# Altium footprint library MainFPs.PcbLib: 215 footprints (part 1 of 14)
Each footprint in its own frame and in the unit in brackets; x right, y up, seen from the top. Pads: shape width x height; smd on the part's side, far side on the other; paste and mask are expansions set on the pad; w line width, h text height; cw(c..) or ccw(c..) is an arc to the next point about the centre after c.
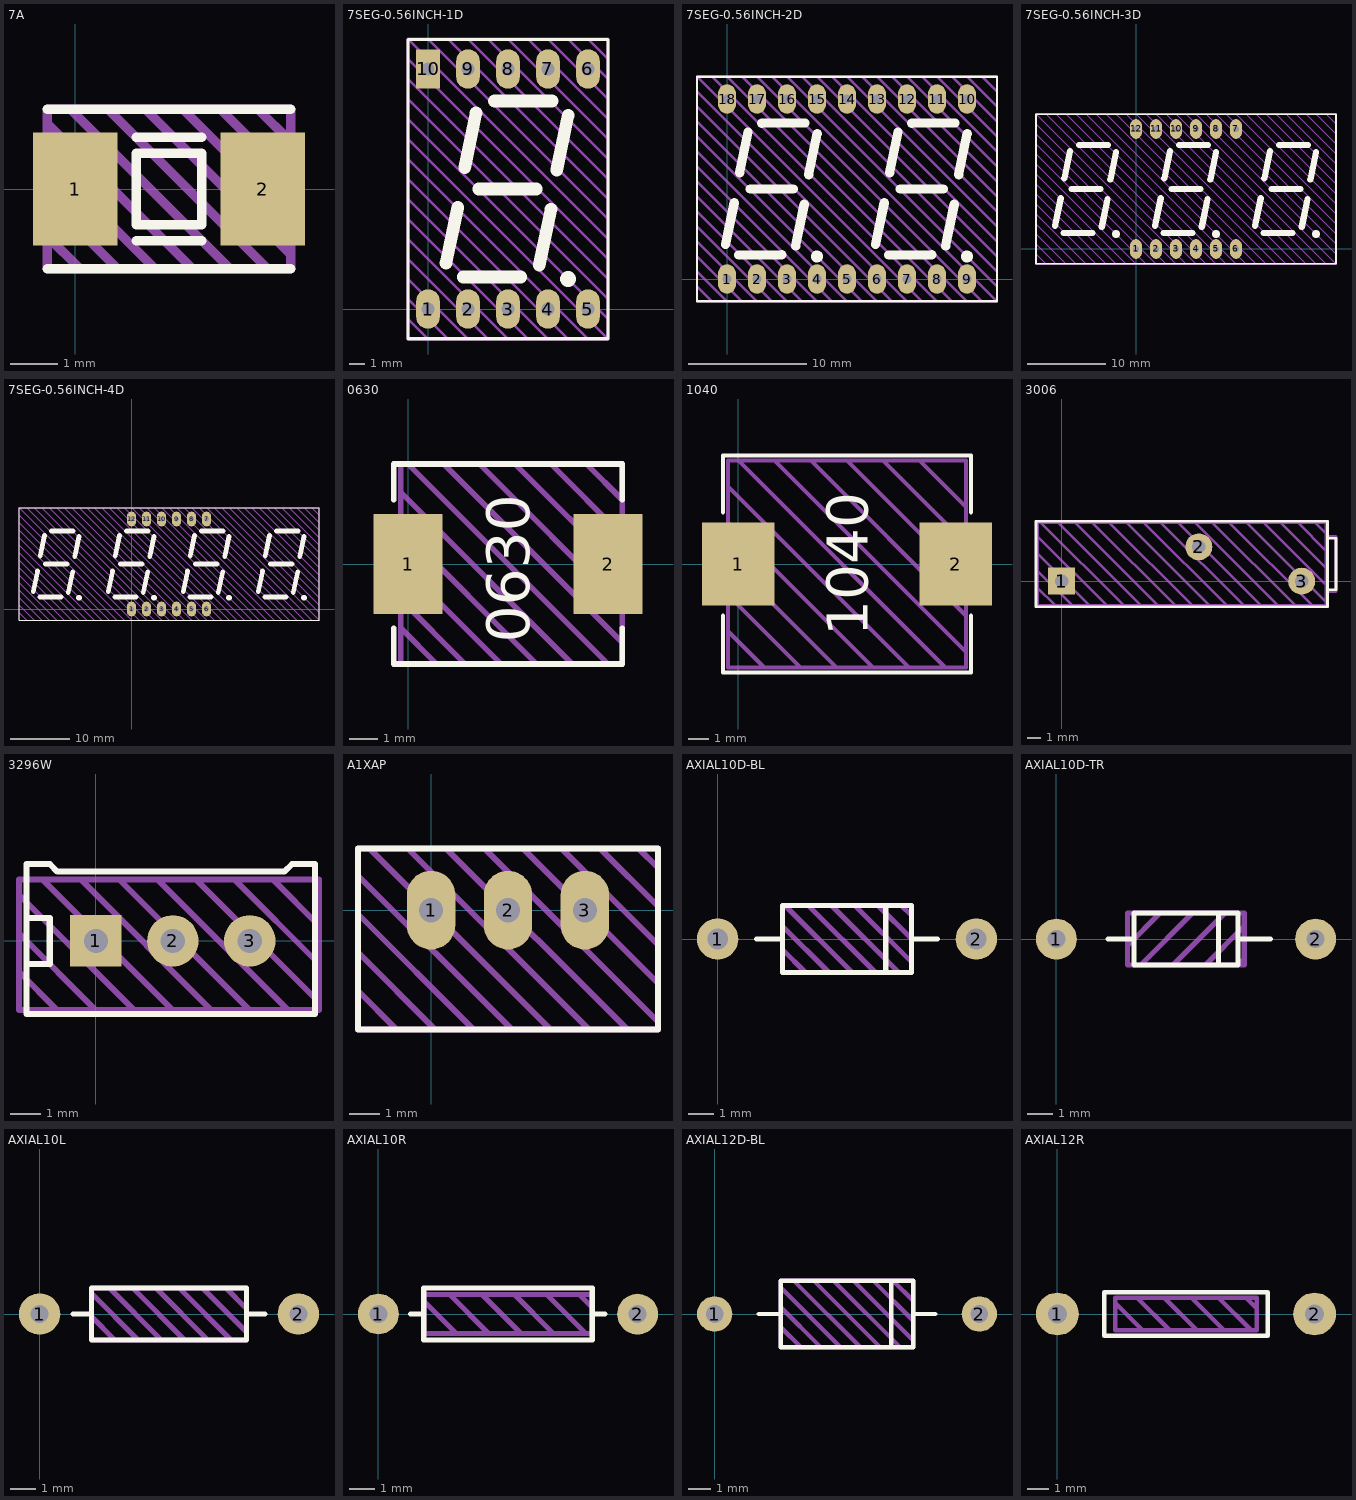
[diagram p0: the footprints below, top view; thin cyan lines are the x and y axes]

## 7A [mm] "SMD Glass Sealing Crystals"
pads (2):
  rect 1.8x2.4 smd: 1(0,0) 2(4,0)
Top Overlay:
  lines w0.2: -0.6,-1.7 4.6,-1.7 ; -0.6,1.7 4.6,1.7 ; 1.3,-1.1 2.7,-1.1 ; 1.3,1.1 2.7,1.1 ; 1.3,-0.762 2.7,-0.762 2.7,0.762 1.3,0.762 1.3,-0.762
Top Draw:
  lines w0.2: -0.6,-1 0.1,-1.7 ; -0.6,-0.2 0.9,-1.7 ; -0.6,0.6 1.7,-1.7 ; -0.6,1.4 2.5,-1.7 ; -0.1,1.7 3.3,-1.7 ; 0.7,1.7 4.1,-1.7 ; 1.5,1.7 4.6,-1.4 ; 2.3,1.7 4.6,-0.6 ; 3.1,1.7 4.6,0.2 ; 3.9,1.7 4.6,1 ; -0.6,-1.7 4.6,-1.7 4.6,1.7 -0.6,1.7 -0.6,-1.7
Top Info:
  text "'.Comment'" at -1.186,-2.837 h0.75
3D body: height 0.6, standoff 0, extent -0.6,-1.7 4.6,1.7
3D body: height 0.8, standoff 0.6, extent -0.4,-1.5 4.4,1.5

## 7SEG-0.56INCH-1D [mm]
pads (10):
  oval 1.5x2.5 hole 0.8: 1(0,0) 2(2.54,0) 3(5.08,0) 4(7.62,0) 5(10.16,0) 6(10.16,15.24) 7(7.62,15.24) 8(5.08,15.24) 9(2.54,15.24)
  rect 1.5x2.5 hole 0.8: 10(0,15.24)
Top Overlay:
  circle w0.8: c8.89,1.905 r0.1
  lines w0.2: -1.27,-1.887 10.584,-1.887 11.43,-1.887 11.43,17.113 -1.27,17.113 -1.27,-1.887
  lines w0.8: 1.143,2.921 1.88,6.45 ; 2.248,2.032 5.898,2.035 ; 2.331,8.988 3.048,12.446 ; 3.23,7.62 6.879,7.62 ; 4.224,13.205 7.874,13.208 ; 7.074,2.794 7.811,6.323 ; 8.177,8.829 8.894,12.287
Top Draw:
  lines w0.2: -1.27,-0.635 0,-1.905 ; -1.27,0.635 1.27,-1.905 ; -1.27,1.905 2.54,-1.905 ; -1.27,3.175 3.81,-1.905 ; -1.27,4.445 5.08,-1.905 ; -1.27,5.715 6.35,-1.905 ; -1.27,6.985 7.62,-1.905 ; -1.27,8.255 8.89,-1.905 ; -1.27,9.525 10.16,-1.905 ; -1.27,10.795 11.43,-1.905 ; -1.27,12.065 11.43,-0.635 ; -1.27,13.335 11.43,0.635 ; -1.27,14.605 11.43,1.905 ; -1.27,15.875 11.43,3.175 ; 0,17.145 11.43,5.715 ; 1.27,17.145 11.43,6.985 ; 2.54,17.145 11.43,8.255 ; 3.81,17.145 11.43,9.525 ; 5.08,17.145 11.43,10.795 ; 6.35,17.145 11.43,12.065 ; 7.62,17.145 11.43,13.335 ; 8.89,17.145 11.43,14.605 ; 10.16,17.145 11.43,15.875 ; 11.43,4.445 -1.27,17.145 ; -1.27,17.145 -1.27,-1.905 11.43,-1.905 ; -1.27,17.145 11.43,17.145 11.43,-1.905
Top Info:
  text "'.Comment'" at -1.27,-4.445 h1.5
3D body "SC56-11.stp": height 8, standoff -2.5, extent -1.17,-1.88 11.33,17.12

## 7SEG-0.56INCH-2D [mm]
pads (18):
  oval 1.5x2.5 hole 0.8: 1(0,0) 2(2.54,0) 3(5.08,0) 4(7.62,0) 5(10.16,0) 6(12.7,0) 7(15.24,0) 8(17.78,0) 9(20.32,0) 10(20.32,15.24) 11(17.78,15.24) 12(15.24,15.24) 13(12.7,15.24) 14(10.16,15.24) 15(7.62,15.24) 16(5.08,15.24) 17(2.54,15.24) 18(0,15.24)
Top Overlay:
  circle w0.8: c7.62,1.905 r0.1
  circle w0.8: c20.32,1.905 r0.1
  lines w0.2: -2.54,-1.887 -2.54,17.113 22.86,17.113 22.86,-1.887 -2.54,-1.887
  lines w0.8: -0.127,2.921 0.61,6.45 ; 0.978,2.032 4.628,2.035 ; 1.061,8.988 1.778,12.446 ; 1.96,7.62 5.609,7.62 ; 2.954,13.205 6.604,13.208 ; 5.804,2.794 6.541,6.323 ; 6.907,8.829 7.624,12.287 ; 12.573,2.921 13.31,6.45 ; 13.678,2.032 17.328,2.035 ; 13.761,8.988 14.478,12.446 ; 14.66,7.62 18.309,7.62 ; 15.654,13.205 19.304,13.208 ; 18.504,2.794 19.241,6.323 ; 19.607,8.829 20.324,12.287
Top Draw:
  lines w0.2: -2.54,-0.635 -1.27,-1.905 ; -2.54,0.635 0,-1.905 ; -2.54,1.905 1.27,-1.905 ; -2.54,3.175 2.54,-1.905 ; -2.54,4.445 3.81,-1.905 ; -2.54,5.715 5.08,-1.905 ; -2.54,6.985 6.35,-1.905 ; -2.54,8.255 7.62,-1.905 ; -2.54,9.525 8.89,-1.905 ; -2.54,10.795 10.16,-1.905 ; -2.54,12.065 11.43,-1.905 ; -2.54,13.335 12.7,-1.905 ; -2.54,14.605 13.97,-1.905 ; -2.54,15.875 15.24,-1.905 ; -1.27,17.145 17.78,-1.905 ; 0,17.145 19.05,-1.905 ; 1.27,17.145 20.32,-1.905 ; 2.54,17.145 21.59,-1.905 ; 3.81,17.145 22.86,-1.905 ; 5.08,17.145 22.86,-0.635 ; 6.35,17.145 22.86,0.635 ; 7.62,17.145 22.86,1.905 ; 8.89,17.145 22.86,3.175 ; 10.16,17.145 22.86,4.445 ; 11.43,17.145 22.86,5.715 ; 12.7,17.145 22.86,6.985 ; 13.97,17.145 22.86,8.255 ; 15.24,17.145 22.86,9.525 ; 16.51,-1.905 -2.54,17.145 ; 16.51,17.145 22.86,10.795 ; 17.78,17.145 22.86,12.065 ; 19.05,17.145 22.86,13.335 ; 20.32,17.145 22.86,14.605 ; 21.59,17.145 22.86,15.875 ; -2.54,17.145 22.86,17.145 22.86,-1.905 ; -2.54,17.145 -2.54,-1.905 22.86,-1.905
Top Info:
  text "'.Comment'" at 3.787,-4.05 h1.5
3D body "DC56-11.stp": height 8, standoff -2.5, extent -2.34,-1.88 22.66,17.12

## 7SEG-0.56INCH-3D [mm]
pads (12):
  oval 1.5x2.5 hole 0.8: 1(0,0) 2(2.54,0) 3(5.08,0) 4(7.62,0) 5(10.16,0) 6(12.7,0) 7(12.7,15.24) 8(10.16,15.24) 9(7.62,15.24) 10(5.08,15.24) 11(2.54,15.24) 12(0,15.24)
Top Overlay:
  circle w0.8: c-2.54,1.905 r0.1
  circle w0.8: c10.16,1.905 r0.1
  circle w0.8: c22.86,1.905 r0.1
  lines w0.2: -12.7,-1.887 -12.7,17.113 25.4,17.113 25.4,-1.887 -12.7,-1.887
  lines w0.8: -10.287,2.921 -9.55,6.45 ; -9.182,2.032 -5.532,2.035 ; -9.099,8.988 -8.382,12.446 ; -8.2,7.62 -4.551,7.62 ; -7.206,13.205 -3.556,13.208 ; -4.356,2.794 -3.619,6.323 ; -3.253,8.829 -2.536,12.287 ; 2.413,2.921 3.15,6.45 ; 3.518,2.032 7.168,2.035 ; 3.601,8.988 4.318,12.446 ; 4.5,7.62 8.149,7.62 ; 5.494,13.205 9.144,13.208 ; 8.344,2.794 9.081,6.323 ; 9.447,8.829 10.164,12.287 ; 15.113,2.921 15.85,6.45 ; 16.218,2.032 19.868,2.035 ; 16.301,8.988 17.018,12.446 ; 17.2,7.62 20.849,7.62 ; 18.194,13.205 21.844,13.208 ; 21.044,2.794 21.781,6.323 ; 22.147,8.829 22.864,12.287
Top Draw:
  lines w0.2: -12.7,-0.635 -11.43,-1.905 ; -12.7,0.635 -10.16,-1.905 ; -12.7,1.905 -8.89,-1.905 ; -12.7,3.175 -7.62,-1.905 ; -12.7,4.445 -6.35,-1.905 ; -12.7,5.715 -5.08,-1.905 ; -12.7,6.985 -3.81,-1.905 ; -12.7,8.255 -2.54,-1.905 ; -12.7,9.525 -1.27,-1.905 ; -12.7,10.795 0,-1.905 ; -12.7,12.065 1.27,-1.905 ; -12.7,13.335 2.54,-1.905 ; -12.7,14.605 3.81,-1.905 ; -12.7,15.875 5.08,-1.905 ; -11.43,17.145 7.62,-1.905 ; -10.16,17.145 8.89,-1.905 ; -8.89,17.145 10.16,-1.905 ; -7.62,17.145 11.43,-1.905 ; -6.35,17.145 12.7,-1.905 ; -5.08,17.145 13.97,-1.905 ; -3.81,17.145 15.24,-1.905 ; -2.54,17.145 16.51,-1.905 ; -1.27,17.145 17.78,-1.905 ; 0,17.145 19.05,-1.905 ; 1.27,17.145 20.32,-1.905 ; 2.54,17.145 21.59,-1.905 ; 3.81,17.145 22.86,-1.905 ; 5.08,17.145 24.13,-1.905 ; 6.35,-1.905 -12.7,17.145 ; 6.35,17.145 25.4,-1.905 ; 7.62,17.145 25.4,-0.635 ; 8.89,17.145 25.4,0.635 ; 10.16,17.145 25.4,1.905 ; 11.43,17.145 25.4,3.175 ; 12.7,17.145 25.4,4.445 ; 13.97,17.145 25.4,5.715 ; 15.24,17.145 25.4,6.985 ; 16.51,17.145 25.4,8.255 ; 17.78,17.145 25.4,9.525 ; 19.05,17.145 25.4,10.795 ; 20.32,17.145 25.4,12.065 ; 21.59,17.145 25.4,13.335 ; 22.86,17.145 25.4,14.605 ; 24.13,17.145 25.4,15.875 ; -12.7,17.145 25.4,17.145 25.4,-1.905 ; -12.7,17.145 -12.7,-1.905 25.4,-1.905
Top Info:
  text "'.Comment'" at -0.023,-4.05 h1.5
3D body "BC56-12.stp": height 8, standoff -2.5, extent -12.4,-1.88 25.1,17.12

## 7SEG-0.56INCH-4D [mm]
pads (12):
  oval 1.5x2.5 hole 0.8: 1(0,0) 2(2.54,0) 3(5.08,0) 4(7.62,0) 5(10.16,0) 6(12.7,0) 7(12.7,15.24) 8(10.16,15.24) 9(7.62,15.24) 10(5.08,15.24) 11(2.54,15.24) 12(0,15.24)
Top Overlay:
  circle w0.8: c29.21,1.905 r0.1
  circle w0.8: c-8.89,1.905 r0.1
  circle w0.8: c3.81,1.905 r0.1
  circle w0.8: c16.51,1.905 r0.1
  lines w0.2: -19.05,-1.887 -19.05,17.113 31.75,17.113 31.75,-1.887 -19.05,-1.887
  lines w0.8: -16.637,2.921 -15.9,6.45 ; -15.532,2.032 -11.882,2.035 ; -15.449,8.988 -14.732,12.446 ; -14.55,7.62 -10.901,7.62 ; -13.556,13.205 -9.906,13.208 ; -10.706,2.794 -9.969,6.323 ; -9.603,8.829 -8.886,12.287 ; -3.937,2.921 -3.2,6.45 ; -2.832,2.032 0.818,2.035 ; -2.749,8.988 -2.032,12.446 ; -1.85,7.62 1.799,7.62 ; -0.856,13.205 2.794,13.208 ; 1.994,2.794 2.731,6.323 ; 3.097,8.829 3.814,12.287 ; 8.763,2.921 9.5,6.45 ; 9.868,2.032 13.518,2.035 ; 9.951,8.988 10.668,12.446 ; 10.85,7.62 14.499,7.62 ; 11.844,13.205 15.494,13.208 ; 14.694,2.794 15.431,6.323 ; 15.797,8.829 16.514,12.287 ; 21.463,2.921 22.2,6.45 ; 22.568,2.032 26.218,2.035 ; 22.651,8.988 23.368,12.446 ; 23.55,7.62 27.199,7.62 ; 24.544,13.205 28.194,13.208 ; 27.394,2.794 28.131,6.323 ; 28.497,8.829 29.214,12.287
Top Draw:
  lines w0.2: -19.05,-0.635 -17.78,-1.905 ; -19.05,0.635 -16.51,-1.905 ; -19.05,1.905 -15.24,-1.905 ; -19.05,3.175 -13.97,-1.905 ; -19.05,4.445 -12.7,-1.905 ; -19.05,5.715 -11.43,-1.905 ; -19.05,6.985 -10.16,-1.905 ; -19.05,8.255 -8.89,-1.905 ; -19.05,9.525 -7.62,-1.905 ; -19.05,10.795 -6.35,-1.905 ; -19.05,12.065 -5.08,-1.905 ; -19.05,13.335 -3.81,-1.905 ; -19.05,14.605 -2.54,-1.905 ; -19.05,15.875 -1.27,-1.905 ; -17.78,17.145 1.27,-1.905 ; -16.51,17.145 2.54,-1.905 ; -15.24,17.145 3.81,-1.905 ; -13.97,17.145 5.08,-1.905 ; -12.7,17.145 6.35,-1.905 ; -11.43,17.145 7.62,-1.905 ; -10.16,17.145 8.89,-1.905 ; -8.89,17.145 10.16,-1.905 ; -7.62,17.145 11.43,-1.905 ; -6.35,17.145 12.7,-1.905 ; -5.08,17.145 13.97,-1.905 ; -3.81,17.145 15.24,-1.905 ; -2.54,17.145 16.51,-1.905 ; -1.27,17.145 17.78,-1.905 ; 0,-1.905 -19.05,17.145 ; 0,17.145 19.05,-1.905 ; 1.27,17.145 20.32,-1.905 ; 2.54,17.145 21.59,-1.905 ; 3.81,17.145 22.86,-1.905 ; 5.08,17.145 24.13,-1.905 ; 7.62,17.145 26.67,-1.905 ; 8.89,17.145 27.94,-1.905 ; 10.16,17.145 29.21,-1.905 ; 11.43,17.145 30.48,-1.905 ; 12.7,17.145 31.75,-1.905 ; 13.97,17.145 31.75,-0.635 ; 15.24,17.145 31.75,0.635 ; 16.51,17.145 31.75,1.905 ; 17.78,17.145 31.75,3.175 ; 19.05,17.145 31.75,4.445 ; 20.32,17.145 31.75,5.715 ; 21.59,17.145 31.75,6.985 ; 22.86,17.145 31.75,8.255 ; 24.13,17.145 31.75,9.525 ; 25.4,-1.905 6.35,17.145 ; 25.4,17.145 31.75,10.795 ; 26.67,17.145 31.75,12.065 ; 27.94,17.145 31.75,13.335 ; 29.21,17.145 31.75,14.605 ; 30.48,17.145 31.75,15.875 ; -19.05,17.145 -19.05,-1.905 6.35,-1.905 ; -19.05,17.145 6.35,17.145 ; 6.35,-1.905 31.75,-1.905 ; 6.35,17.145 31.75,17.145 31.75,-1.905
Top Info:
  text "'.Comment'" at -0.023,-4.05 h1.5
3D body "CC56-12.stp": height 8, standoff -2.5, extent -18.65,-1.88 31.35,17.12

## 0630 [mm] "06030 Power Inductor"
pads (2):
  rect 2.4x3.5 smd: 1(0,0) 2(7,0)
Top Overlay:
  lines w0.2: -0.5,-2.25 -0.5,-3.5 7.5,-3.5 7.5,-2.25 ; -0.5,2.25 -0.5,3.5 7.5,3.5 7.5,2.25
  text "0630" at 4.25,-2.749 h1.5
Top Draw:
  lines w0.2: -0.25,-2.25 1,-3.5 ; -0.25,-1.25 2,-3.5 ; -0.25,0 3.25,-3.5 ; -0.25,1.25 4.5,-3.5 ; -0.25,2.5 5.75,-3.5 ; 0,3.5 7,-3.5 ; 1.25,3.5 7.5,-2.75 ; 2.5,3.5 7.5,-1.5 ; 3.75,3.5 7.5,-0.25 ; 5,3.5 7.5,1 ; 6.25,3.5 7.5,2.25 ; -0.25,-3.5 -0.25,3.5 7.5,3.5 7.5,-3.5 -0.25,-3.5
Top Info:
  text "'.Comment'" at -0.749,-4.983 h1
3D body "CIP0630.step": height 3.2, standoff 0, extent -0.3,-3.375 7.3,3.375

## 1040 [mm] "10040 Power Inductor"
pads (2):
  rect 3.5x4 smd: 1(0,0) 2(10.5,0)
Top Overlay:
  lines w0.2: -0.75,-2.5 -0.75,-5.25 11.25,-5.25 11.25,-2.5 ; -0.75,2.5 -0.75,5.25 11.25,5.25 11.25,2.5
  text "1040" at 6.25,-3.499 h2
Top Draw:
  lines w0.2: -0.5,-3.25 1.25,-5 ; -0.5,-1.5 3,-5 ; -0.5,0.25 4.75,-5 ; -0.5,2 6.5,-5 ; -0.5,3.75 8.25,-5 ; 0,5 10,-5 ; 1.75,5 11,-4.25 ; 3.5,5 11,-2.5 ; 5.25,5 11,-0.75 ; 7,5 11,1 ; 8.75,5 11,2.75 ; -0.5,-5 11,-5 11,5 -0.5,5 -0.5,-5
Top Info:
  text "'.Comment'" at -1.123,-7.475 h1.5
3D body "CIP1040.step": height 4.2, standoff 0, extent -0.4,-5 10.9,5

## 3006 [mm]
pads (3):
  rect 2x2 hole 1: 1(0,0)
  round 2 hole 1: 2(10.16,2.54) 3(17.78,0)
Top Overlay:
  lines w0.2: 19.685,-0.635 20.32,-0.635 20.32,3.175 19.685,3.175 ; -1.905,-1.905 -1.905,4.445 19.685,4.445 19.685,-1.905 -1.905,-1.905
Top Draw:
  lines w0.2: -1.778,-0.508 -0.508,-1.778 ; -1.778,0.762 0.762,-1.778 ; -1.778,2.032 2.032,-1.778 ; -1.778,3.302 3.302,-1.778 3.556,-1.778 ; -1.524,4.318 4.572,-1.778 ; -0.254,4.318 5.842,-1.778 ; 1.016,4.318 7.112,-1.778 7.366,-1.778 ; 2.286,4.318 8.382,-1.778 8.89,-1.778 ; 3.556,4.318 9.652,-1.778 ; 4.826,4.318 10.922,-1.778 ; 6.096,4.318 12.192,-1.778 ; 7.366,4.318 13.462,-1.778 ; 8.636,4.318 14.732,-1.778 ; 9.906,4.318 16.002,-1.778 ; 11.176,4.318 17.272,-1.778 ; 12.446,4.318 18.542,-1.778 ; 13.716,4.318 19.558,-1.524 ; 14.986,4.318 19.558,-0.254 ; 16.256,4.318 19.558,1.016 ; 17.526,4.318 19.558,2.286 19.558,2.032 ; 18.796,4.318 19.558,3.556 ; 19.558,-0.762 20.32,-0.762 20.32,3.302 19.558,3.302 ; -1.778,-1.778 19.558,-1.778 19.558,4.318 -1.778,4.318 -1.778,-1.778
Top Info:
  text "'.Comment'" at 2.927,-4.075 h1.5
3D body: height 0.25, standoff 0, extent 18.796,-1.778 19.685,4.318
3D body: height 5.7, standoff 3.3, extent 19.6,0.07 20.6,2.47
3D body: height 6.35, standoff 0.25, extent -1.778,-1.778 19.685,4.318
3D body: height -1, standoff -3, extent -0.402,-0.4 0.398,0.4
3D body: height -1, standoff -3, extent 9.76,2.14 10.56,2.94
3D body: height -1, standoff -3, extent 17.38,-0.4 18.18,0.4
3D body: height 0.25, standoff 0, extent -1.778,-1.778 -0.889,4.318
3D body: height 5.69, standoff 3.31, extent 20.6,1.369 20.8,2.467
3D body: height 5.69, standoff 3.31, extent 20.6,0.072 20.8,1.171

## 3296W [mm]
pads (3):
  rect 1.7x1.7 hole 0.8: 1(0,0)
  round 1.7 hole 0.8: 2(2.54,0) 3(5.08,0)
Top Overlay:
  lines w0.2: -2.286,-0.762 -1.524,-0.762 -1.524,0.762 -2.286,0.762 ; -2.286,-2.413 -2.286,2.54 -1.524,2.54 -1.27,2.286 -0.381,2.286 0.254,2.286 5.334,2.286 6.096,2.286 6.223,2.286 6.477,2.54 7.239,2.54 7.239,-2.413 -2.286,-2.413
Top Draw:
  lines w0.2: -2.54,-1.016 -1.27,-2.286 ; -2.54,0.254 0,-2.286 ; -2.54,1.524 1.27,-2.286 ; -1.778,2.032 2.54,-2.286 ; -0.508,2.032 3.81,-2.286 ; 0.762,2.032 5.08,-2.286 ; 2.032,2.032 6.35,-2.286 ; 3.302,2.032 7.366,-2.032 7.366,-0.762 4.572,2.032 5.842,2.032 7.366,0.508 ; -2.54,-2.286 -2.54,2.032 7.366,2.032 7.366,-2.286 -2.54,-2.286
Top Info:
  text "'.Comment'" at -1.749,-3.883 h1
3D body "3296W.STEP": height 11.65, standoff -2.5, extent -2.225,-2.415 7.305,2.415

## A1XAP [mm] "NKK Switches A-Series Toggle Switch"
pads (3):
  oval 1.6x2.6 hole 0.8: 1(0,0) 2(2.54,0) 3(5.08,0)
Top Overlay:
  lines w0.2: -2.413,-3.937 -2.413,2.032 7.493,2.032 7.493,-3.937 -2.413,-3.937
Top Draw:
  lines w0.2: -2.413,-2.667 -1.143,-3.937 ; -2.413,-1.397 0.127,-3.937 ; -2.413,-0.127 1.397,-3.937 ; -2.413,1.143 2.667,-3.937 ; -2.032,2.032 3.937,-3.937 ; -0.762,2.032 5.207,-3.937 ; 0.508,2.032 6.477,-3.937 ; 1.778,2.032 7.493,-3.683 ; 3.048,2.032 7.493,-2.413 ; 4.318,2.032 7.493,-1.143 ; 5.588,2.032 7.493,0.127 ; 6.858,2.032 7.493,1.397 ; -2.413,-3.937 -2.413,2.032 7.493,2.032 7.493,-3.937 -2.413,-3.937
Top Info:
  text "'.Comment'" at -1.749,-5.383 h1
3D body "A13AP.stp": height 21.83, standoff -3.06, extent -2.362,-3.861 7.442,1.981

## AXIAL10D-BL [mm]
pads (2):
  round 1.6 hole 0.8: 1(0,0) 2(10,0)
Top Overlay:
  lines w0.2: 1.5,0 2.5,0 ; 6.5,-1.3 6.5,1.3 ; 7.5,0 8.5,0 ; 2.5,-1.3 7.5,-1.3 7.5,1.3 2.5,1.3 2.5,-1.3
Top Draw:
  lines w0.2: 2.5,-0.4 3.4,-1.3 ; 2.5,0.5 4.3,-1.3 ; 2.6,1.3 5.2,-1.3 ; 3.5,1.3 6.1,-1.3 ; 4.4,1.3 7,-1.3 ; 5.3,1.3 7.5,-0.9 ; 6.2,1.3 7.5,0 ; 7.1,1.3 7.5,0.9 ; 2.5,-1.3 7.5,-1.3 7.5,1.3 2.5,1.3 2.5,-1.3
Top Info:
  text "'.Comment'" at 1.814,-2.437 h0.75
3D body "AXIAL10D-BL.stp": height 2.74, standoff -2.6, extent -0.25,-1.25 10.25,1.25

## AXIAL10D-TR [mm]
pads (2):
  round 1.6 hole 0.7: 1(0,-0.001) 2(10.161,-0.001)
Top Overlay:
  lines w0.2: 2.032,0 2.286,0 3.048,0 ; 6.35,-1.016 6.35,1.016 ; 7.112,0 8.128,0 8.382,0 ; 3.048,-1.016 3.048,1.016 7.112,1.016 7.112,-1.016 3.048,-1.016
Top Draw:
  lines w0.2: 2.793,-0.253 4.065,1.019 ; 3.303,-1.013 5.335,1.019 ; 4.573,-1.013 6.605,1.019 ; 5.843,-1.013 7.365,0.509 ; 7.113,-1.013 7.365,-0.761 ; 2.794,-1.013 2.794,1.019 7.366,1.019 7.366,-1.013 2.794,-1.013
Top Info:
  text "'.Comment'" at 1.814,-2.237 h0.75
3D body "AXIAL10D-TR-P2.stp": height 2.25, standoff 0.25, extent 3.85,-1 7.149,0.985
3D body "AXIAL10D-TR-P1.stp": height 2.25, standoff -2.6, extent -0.1,-0.993 10.398,0.993

## AXIAL10L [mm]
pads (2):
  round 1.6 hole 0.7: 1(0,0) 2(10,0)
Top Overlay:
  lines w0.2: 1.3,0 2,0 ; 8,0 8.7,0 ; 2,-1 8,-1 8,1 2,1 2,-1
Top Draw:
  lines w0.2: 2,-0.1 2.9,-1 ; 2,0.8 3.8,-1 ; 2.7,1 4.7,-1 ; 3.6,1 5.6,-1 ; 4.5,1 6.5,-1 ; 5.4,1 7.4,-1 ; 6.3,1 8,-0.7 ; 7.2,1 8,0.2 ; 2,-1 8,-1 8,1 2,1 2,-1
Top Info:
  text "'.Comment'" at 1.814,-2.137 h0.75
3D body "AXIAL10L.stp": height 2.25, standoff -2.6, extent -0.249,-0.993 10.249,0.993

## AXIAL10R [mm]
pads (2):
  round 1.6 hole 0.7: 1(0.001,0.003) 2(10.16,-0.003)
Top Overlay:
  lines w0.2: 1.27,0 1.778,0 ; 8.382,0 8.89,0 ; 1.778,-1.013 1.778,1.019 8.382,1.019 8.382,-1.013 6.938,-1.013 3.128,-1.013 1.778,-1.013
Top Draw:
  lines w0.2: 1.778,0.511 3.048,-0.759 4.318,-0.759 2.794,0.765 4.064,0.765 5.588,-0.759 6.858,-0.759 5.334,0.765 6.604,0.765 8.128,-0.759 ; 7.874,0.765 8.382,0.257 ; 1.778,-0.759 8.382,-0.759 8.382,0.765 1.778,0.765 1.778,-0.759
Top Info:
  text "'.Comment'" at 0.751,-2.883 h1
3D body: height 2.79, standoff 0.25, extent 3.175,-1.268 6.985,1.272
3D body: height 2.82, standoff 0.23, extent 6.223,-1.293 6.604,1.298
3D body: height 2.82, standoff 0.23, extent 5.207,-1.292 5.588,1.298
3D body: height 2.82, standoff 0.23, extent 4.445,-1.293 4.826,1.298
3D body: height 2.82, standoff 0.23, extent 3.683,-1.292 4.064,1.298
3D body: height 3.05, standoff 0, extent 1.027,-1.503 4.053,1.516
3D body: height 3.05, standoff 0, extent 6.107,-1.501 9.133,1.519
3D body: height 1.52, standoff -1.78, extent 9.906,-0.257 10.414,0.251
3D body: height 1.78, standoff 1.27, extent 6.35,-0.258 10.16,0.25
3D body: height 1.78, standoff 1.27, extent 9.906,-0.257 10.414,0.251
3D body: height 1.78, standoff 1.27, extent -0.253,-0.257 0.255,0.251
3D body: height 1.78, standoff 1.27, extent 0.001,-0.252 3.811,0.256
3D body: height 1.52, standoff -1.78, extent -0.254,-0.254 0.254,0.254

## AXIAL12D-BL [mm]
pads (2):
  round 1.6 hole 0.8: 1(0,0) 2(12,0)
Top Overlay:
  lines w0.2: 2,0 3,0 ; 8,-1.5 8,1.5 ; 9,0 10,0 ; 3,-1.5 3,1.5 9,1.5 9,-1.5 3,-1.5
Top Draw:
  lines w0.2: 3,-0.6 3.9,-1.5 ; 3,0.3 4.8,-1.5 ; 3,1.2 5.7,-1.5 ; 3.6,1.5 6.6,-1.5 ; 4.5,1.5 7.5,-1.5 ; 5.4,1.5 8.4,-1.5 ; 6.3,1.5 9,-1.2 ; 7.2,1.5 9,-0.3 ; 8.1,1.5 9,0.6 ; 3,-1.5 3,1.5 9,1.5 9,-1.5 3,-1.5
Top Info:
  text "'.Comment'" at 2.814,-2.637 h0.75
3D body "AXIAL12D-BL.stp": height 3.24, standoff -2.6, extent -0.3,-1.5 12.3,1.5

## AXIAL12R [mm]
pads (2):
  round 2 hole 0.9: 1(0,0) 2(12,0)
Top Overlay:
  lines w0.2: 2.19,-1.016 2.19,1.016 9.81,1.016 9.81,-1.016 7.905,-1.016 4.095,-1.016 2.19,-1.016
Top Draw:
  lines w0.2: 2.698,0.508 3.968,-0.762 5.238,-0.762 3.714,0.762 4.984,0.762 6.508,-0.762 7.778,-0.762 6.254,0.762 7.524,0.762 9.048,-0.762 ; 8.794,0.762 9.302,0.254 ; 2.698,-0.762 9.302,-0.762 9.302,0.762 2.698,0.762 2.698,-0.762
Top Info:
  text "'.Comment'" at 1.751,-2.883 h1
3D body: height 2.79, standoff 0.25, extent 4.07,-1.278 7.88,1.262
3D body: height 3.05, standoff 0, extent 1.947,-1.513 4.973,1.507
3D body: height 1.52, standoff -1.78, extent -0.301,-0.303 0.299,0.297
3D body: height 1.82, standoff 1.22, extent 0,-0.3 3.81,0.3
3D body: height 1.82, standoff 1.22, extent -0.3,-0.306 0.3,0.294
3D body: height 1.82, standoff 1.22, extent 11.765,-0.3 12.365,0.3
3D body: height 1.82, standoff 1.22, extent 8.255,-0.301 12.065,0.299
3D body: height 1.52, standoff -1.78, extent 11.765,-0.3 12.365,0.3
3D body: height 3.05, standoff 0, extent 7.027,-1.51 10.053,1.51
3D body: height 2.82, standoff 0.23, extent 4.603,-1.302 4.984,1.289
3D body: height 2.82, standoff 0.23, extent 5.365,-1.302 5.746,1.289
3D body: height 2.82, standoff 0.23, extent 6.127,-1.301 6.508,1.289
3D body: height 2.82, standoff 0.23, extent 7.143,-1.302 7.524,1.289